# Altium footprint library Reflow3D1411sep.PcbLib: 657 footprints (part 40 of 42)
Each footprint in its own frame and in the unit in brackets; x right, y up, seen from the top. Pads: shape width x height; smd on the part's side, far side on the other; paste and mask are expansions set on the pad; w line width, h text height; cw(c..) or ccw(c..) is an arc to the next point about the centre after c.
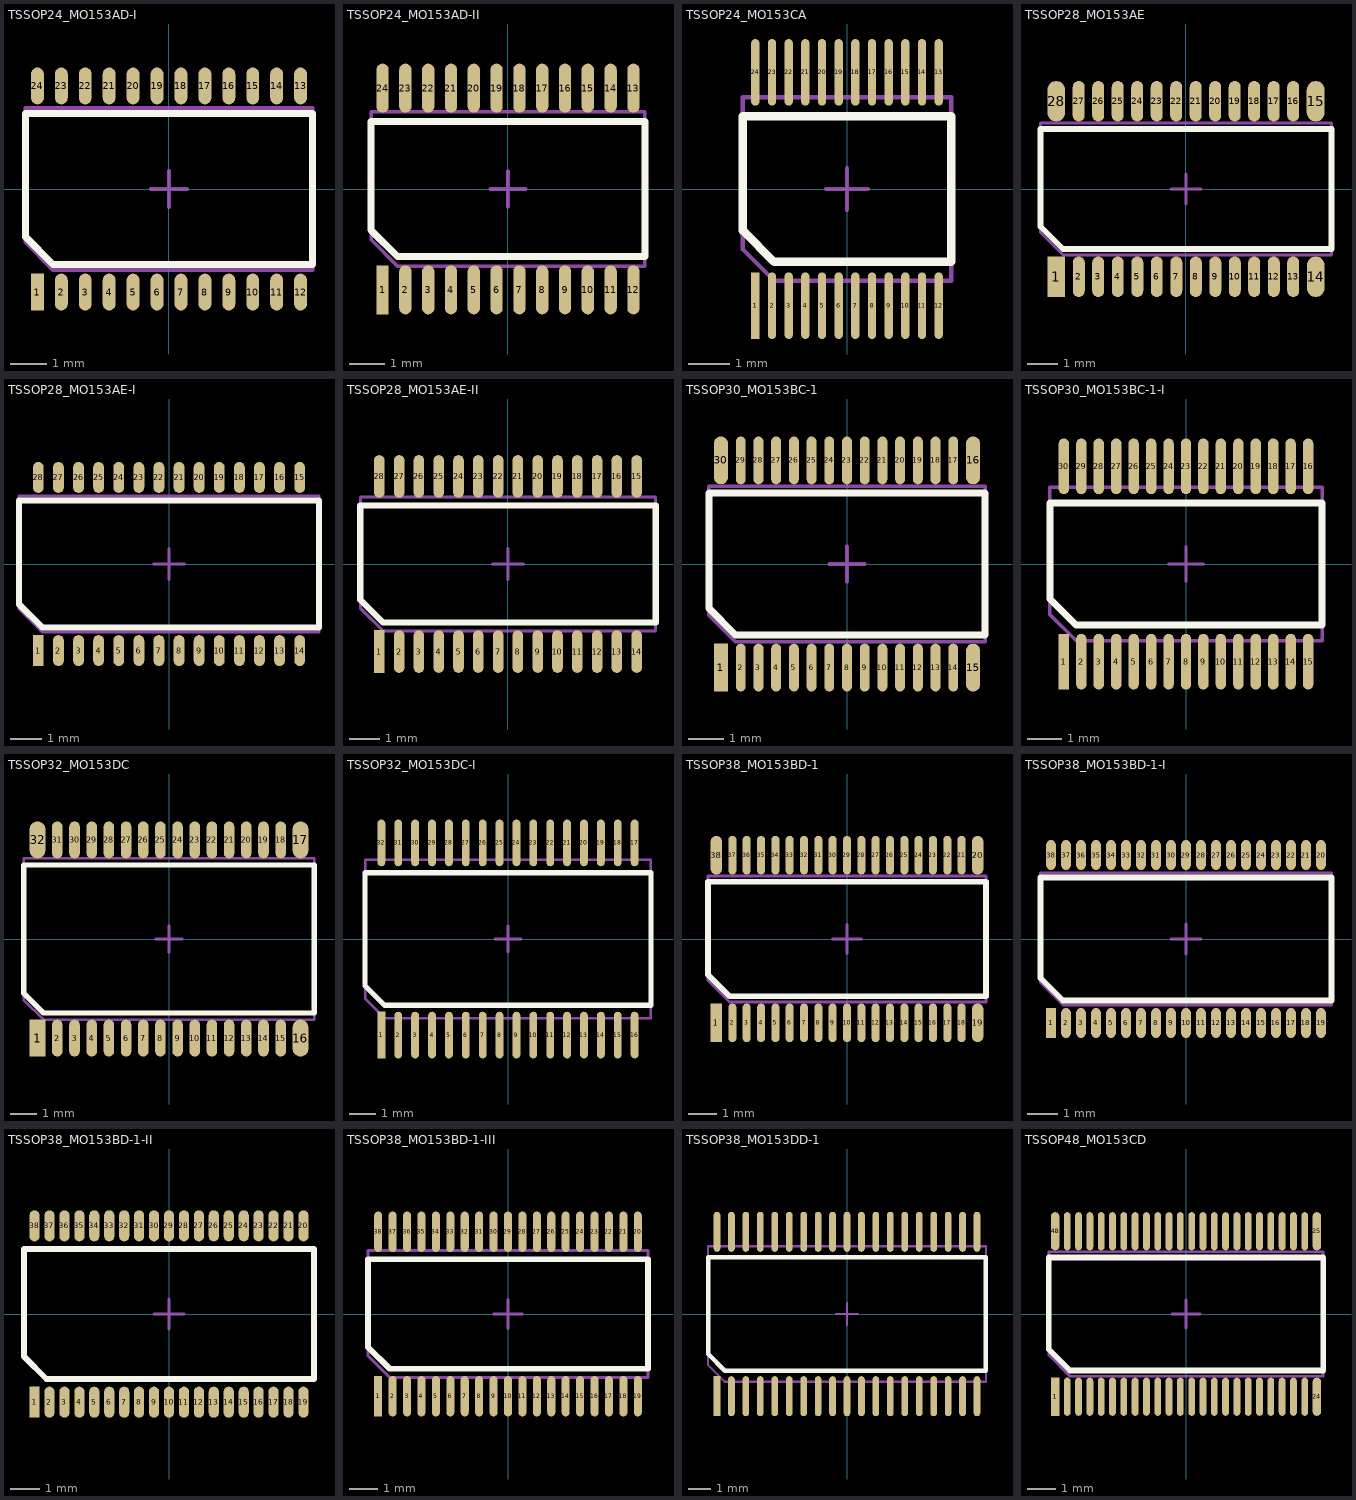
[diagram p39: the footprints below, top view; thin cyan lines are the x and y axes]

## TSSOP24_MO153AD-I [mm] "www.analog.com, 380523655245964505593671154107510036154RU24.pdf, ru-24.pdf; www.jedec.org, MO-153f.pdf"
height 1.1
pads (24):
  rect 0.35x1 smd mask+0.075: 1(-3.575,-2.8)
  oval 0.35x1 smd mask+0.075: 2(-2.925,-2.8) 3(-2.275,-2.8) 4(-1.625,-2.8) 5(-0.975,-2.8) 6(-0.325,-2.8) 7(0.325,-2.8) 8(0.975,-2.8) 9(1.625,-2.8) 10(2.275,-2.8) 11(2.925,-2.8) 12(3.575,-2.8) 13(3.575,2.8) 14(2.925,2.8) 15(2.275,2.8) 16(1.625,2.8) 17(0.975,2.8) 18(0.325,2.8) 19(-0.325,2.8) 20(-0.975,2.8) 21(-1.625,2.8) 22(-2.275,2.8) 23(-2.925,2.8) 24(-3.575,2.8)
Top Overlay:
  lines w0.2: -3.9,-1.3 -3.15,-2.05 3.9,-2.05 3.9,2.05 -3.9,2.05 -3.9,-1.3
Mechanical 13:
  lines w0.1: -3.9,-1.45 -3.15,-2.2 3.9,-2.2 3.9,2.2 -3.9,2.2 -3.9,-1.45
Mechanical 15:
  lines w0.1: -0.5,0 0.5,0 ; 0,-0.5 0,0.5
3D body: height 1.2, standoff 0, extent -3.95,-2.25 3.95,2.25

## TSSOP24_MO153AD-II [mm] "www.maxim-ic.com, 21-0066.PDF, 90-0118.PDF"
height 1
pads (24):
  rect 0.35x1.4 smd mask+0.075: 1(-3.575,-2.875)
  oval 0.35x1.4 smd mask+0.075: 2(-2.925,-2.875) 3(-2.275,-2.875) 4(-1.625,-2.875) 5(-0.975,-2.875) 6(-0.325,-2.875) 7(0.325,-2.875) 8(0.975,-2.875) 9(1.625,-2.875) 10(2.275,-2.875) 11(2.925,-2.875) 12(3.575,-2.875) 13(3.575,2.875) 14(2.925,2.875) 15(2.275,2.875) 16(1.625,2.875) 17(0.975,2.875) 18(0.325,2.875) 19(-0.325,2.875) 20(-0.975,2.875) 21(-1.625,2.875) 22(-2.275,2.875) 23(-2.925,2.875) 24(-3.575,2.875)
Top Overlay:
  lines w0.2: -3.9,-1.175 -3.9,1.925 3.9,1.925 3.9,-1.925 -3.15,-1.925 -3.9,-1.175
Mechanical 13:
  lines w0.1: -3.9,-1.45 -3.9,2.2 3.9,2.2 3.9,-2.2 -3.15,-2.2 -3.9,-1.45
Mechanical 15:
  lines w0.1: -0.5,0 0.5,0 ; 0,-0.5 0,0.5
3D body: height 1.1, standoff 0, extent -3.95,-2.25 3.95,2.25

## TSSOP24_MO153CA [mm] "www.ti.com, mpds006c.pdf, DGV24.asc"
height 1.1
pads (24):
  rect 0.2x1.6 smd mask+0.05: 1(-2.2,-2.8)
  oval 0.2x1.6 smd mask+0.05: 2(-1.8,-2.8) 3(-1.4,-2.8) 4(-1,-2.8) 5(-0.6,-2.8) 6(-0.2,-2.8) 7(0.2,-2.8) 8(0.6,-2.8) 9(1,-2.8) 10(1.4,-2.8) 11(1.8,-2.8) 12(2.2,-2.8) 13(2.2,2.8) 14(1.8,2.8) 15(1.4,2.8) 16(1,2.8) 17(0.6,2.8) 18(0.2,2.8) 19(-0.2,2.8) 20(-0.6,2.8) 21(-1,2.8) 22(-1.4,2.8) 23(-1.8,2.8) 24(-2.2,2.8)
Top Overlay:
  lines w0.2: -2.5,-1 -2.5,1.75 2.5,1.75 2.5,-1.75 -1.75,-1.75 -2.5,-1
Mechanical 13:
  lines w0.1: -2.5,-1.45 -1.75,-2.2 2.5,-2.2 2.5,2.2 -2.5,2.2 -2.5,-1.45
Mechanical 15:
  lines w0.1: -0.5,0 0.5,0 ; 0,-0.5 0,0.5
3D body: height 1.2, standoff 0, extent -2.55,-2.25 2.55,2.25

## TSSOP28_MO153AE [mm] "www.nxp.com, sot361-1_po.pdf, SOT361-1_fp_reflow.pdf"
height 0.98
pads (28):
  rect 0.6x1.35 smd mask+0.05: 1(-4.325,-2.925)
  oval 0.4x1.35 smd mask+0.05: 2(-3.575,-2.925) 3(-2.925,-2.925) 4(-2.275,-2.925) 5(-1.625,-2.925) 6(-0.975,-2.925) 7(-0.325,-2.925) 8(0.325,-2.925) 9(0.975,-2.925) 10(1.625,-2.925) 11(2.275,-2.925) 12(2.925,-2.925) 13(3.575,-2.925) 16(3.575,2.925) 17(2.925,2.925) 18(2.275,2.925) 19(1.625,2.925) 20(0.975,2.925) 21(0.325,2.925) 22(-0.325,2.925) 23(-0.975,2.925) 24(-1.625,2.925) 25(-2.275,2.925) 26(-2.925,2.925) 27(-3.575,2.925)
  oval 0.6x1.35 smd mask+0.05: 14(4.325,-2.925) 15(4.325,2.925) 28(-4.325,2.925)
Top Overlay:
  lines w0.2: -4.85,-1.25 -4.1,-2 4.85,-2 4.85,2 -4.85,2 -4.85,-1.25
Mechanical 13:
  lines w0.1: -4.85,-1.45 -4.85,2.2 4.85,2.2 4.85,-2.2 -4.1,-2.2 -4.85,-1.45
Mechanical 15:
  lines w0.1: -0.5,0 0.5,0 ; 0,-0.5 0,0.5
3D body: height 1.1, standoff 0, extent -4.9,-2.25 4.9,2.25

## TSSOP28_MO153AE-I [mm] "www.analog.com, 249854663RU_28.pdf, ru-28.pdf; www.jedec.org, MO-153f.pdf"
height 1.1
pads (28):
  rect 0.35x1 smd mask+0.075: 1(-4.225,-2.8)
  oval 0.35x1 smd mask+0.075: 2(-3.575,-2.8) 3(-2.925,-2.8) 4(-2.275,-2.8) 5(-1.625,-2.8) 6(-0.975,-2.8) 7(-0.325,-2.8) 8(0.325,-2.8) 9(0.975,-2.8) 10(1.625,-2.8) 11(2.275,-2.8) 12(2.925,-2.8) 13(3.575,-2.8) 14(4.225,-2.8) 15(4.225,2.8) 16(3.575,2.8) 17(2.925,2.8) 18(2.275,2.8) 19(1.625,2.8) 20(0.975,2.8) 21(0.325,2.8) 22(-0.325,2.8) 23(-0.975,2.8) 24(-1.625,2.8) 25(-2.275,2.8) 26(-2.925,2.8) 27(-3.575,2.8) 28(-4.225,2.8)
Top Overlay:
  lines w0.2: -4.85,-1.3 -4.85,2.05 4.85,2.05 4.85,-2.05 -4.1,-2.05 -4.85,-1.3
Mechanical 13:
  lines w0.1: -4.85,-1.45 -4.85,2.2 4.85,2.2 4.85,-2.2 -4.1,-2.2 -4.85,-1.45
Mechanical 15:
  lines w0.1: -0.5,0 0.5,0 ; 0,-0.5 0,0.5
3D body: height 1.2, standoff 0, extent -4.9,-2.25 4.9,2.25

## TSSOP28_MO153AE-II [mm] "www.maxim-ic.com, 21-0066.PDF, 90-0171.PDF"
height 1
pads (28):
  rect 0.35x1.4 smd mask+0.075: 1(-4.225,-2.875)
  oval 0.35x1.4 smd mask+0.075: 2(-3.575,-2.875) 3(-2.925,-2.875) 4(-2.275,-2.875) 5(-1.625,-2.875) 6(-0.975,-2.875) 7(-0.325,-2.875) 8(0.325,-2.875) 9(0.975,-2.875) 10(1.625,-2.875) 11(2.275,-2.875) 12(2.925,-2.875) 13(3.575,-2.875) 14(4.225,-2.875) 15(4.225,2.875) 16(3.575,2.875) 17(2.925,2.875) 18(2.275,2.875) 19(1.625,2.875) 20(0.975,2.875) 21(0.325,2.875) 22(-0.325,2.875) 23(-0.975,2.875) 24(-1.625,2.875) 25(-2.275,2.875) 26(-2.925,2.875) 27(-3.575,2.875) 28(-4.225,2.875)
Top Overlay:
  lines w0.2: -4.85,-1.175 -4.85,1.925 4.85,1.925 4.85,-1.925 -4.1,-1.925 -4.85,-1.175
Mechanical 13:
  lines w0.1: -4.85,-1.45 -4.1,-2.2 4.85,-2.2 4.85,2.2 -4.85,2.2 -4.85,-1.45
Mechanical 15:
  lines w0.1: -0.5,0 0.5,0 ; 0,-0.5 0,0.5
3D body: height 1.1, standoff 0, extent -4.9,-2.25 4.9,2.25

## TSSOP30_MO153BC-1 [mm] "www.nxp.com, sot607-1_po.pdf, sot607-1_fr.pdf"
height 1
pads (30):
  rect 0.4x1.35 smd mask+0.05: 1(-3.56,-2.925)
  oval 0.28x1.35 smd mask+0.05: 2(-3,-2.925) 3(-2.5,-2.925) 4(-2,-2.925) 5(-1.5,-2.925) 6(-1,-2.925) 7(-0.5,-2.925) 8(0,-2.925) 9(0.5,-2.925) 10(1,-2.925) 11(1.5,-2.925) 12(2,-2.925) 13(2.5,-2.925) 14(3,-2.925) 17(3,2.925) 18(2.5,2.925) 19(2,2.925) 20(1.5,2.925) 21(1,2.925) 22(0.5,2.925) 23(0,2.925) 24(-0.5,2.925) 25(-1,2.925) 26(-1.5,2.925) 27(-2,2.925) 28(-2.5,2.925) 29(-3,2.925)
  oval 0.4x1.35 smd mask+0.05: 15(3.56,-2.925) 16(3.56,2.925) 30(-3.56,2.925)
Top Overlay:
  lines w0.2: -3.9,-1.25 -3.9,2 3.9,2 3.9,-2 -3.15,-2 -3.9,-1.25
Mechanical 13:
  lines w0.1: -3.9,-1.45 -3.15,-2.2 3.9,-2.2 3.9,2.2 -3.9,2.2 -3.9,-1.45
Mechanical 15:
  lines w0.1: -0.5,0 0.5,0 ; 0,-0.5 0,0.5
3D body: height 1.1, standoff 0, extent -3.95,-2.25 3.95,2.25

## TSSOP30_MO153BC-1-I [mm] "www.ti.com, mpds019g.pdf, DBT30.asc; www.jedec.org, MO-153f.pdf"
height 1.1
pads (30):
  rect 0.3x1.6 smd mask+0.05: 1(-3.5,-2.8)
  oval 0.3x1.6 smd mask+0.05: 2(-3,-2.8) 3(-2.5,-2.8) 4(-2,-2.8) 5(-1.5,-2.8) 6(-1,-2.8) 7(-0.5,-2.8) 8(0,-2.8) 9(0.5,-2.8) 10(1,-2.8) 11(1.5,-2.8) 12(2,-2.8) 13(2.5,-2.8) 14(3,-2.8) 15(3.5,-2.8) 16(3.5,2.8) 17(3,2.8) 18(2.5,2.8) 19(2,2.8) 20(1.5,2.8) 21(1,2.8) 22(0.5,2.8) 23(0,2.8) 24(-0.5,2.8) 25(-1,2.8) 26(-1.5,2.8) 27(-2,2.8) 28(-2.5,2.8) 29(-3,2.8) 30(-3.5,2.8)
Top Overlay:
  lines w0.2: -3.9,-1 -3.15,-1.75 3.9,-1.75 3.9,1.75 -3.9,1.75 -3.9,-1
Mechanical 13:
  lines w0.1: -3.9,-1.45 -3.9,2.2 3.9,2.2 3.9,-2.2 -3.15,-2.2 -3.9,-1.45
Mechanical 15:
  lines w0.1: -0.5,0 0.5,0 ; 0,-0.5 0,0.5
3D body: height 1.2, standoff 0, extent -3.95,-2.25 3.95,2.25

## TSSOP32_MO153DC [mm] "www.nxp.com, sot487-1_po.pdf, sot487-1_fr.pdf"
height 1
pads (32):
  rect 0.6x1.4 smd mask+0.05: 1(-4.975,-3.75)
  oval 0.4x1.4 smd mask+0.05: 2(-4.225,-3.75) 3(-3.575,-3.75) 4(-2.925,-3.75) 5(-2.275,-3.75) 6(-1.625,-3.75) 7(-0.975,-3.75) 8(-0.325,-3.75) 9(0.325,-3.75) 10(0.975,-3.75) 11(1.625,-3.75) 12(2.275,-3.75) 13(2.925,-3.75) 14(3.575,-3.75) 15(4.225,-3.75) 18(4.225,3.75) 19(3.575,3.75) 20(2.925,3.75) 21(2.275,3.75) 22(1.625,3.75) 23(0.975,3.75) 24(0.325,3.75) 25(-0.325,3.75) 26(-0.975,3.75) 27(-1.625,3.75) 28(-2.275,3.75) 29(-2.925,3.75) 30(-3.575,3.75) 31(-4.225,3.75)
  oval 0.6x1.4 smd mask+0.05: 16(4.975,-3.75) 17(4.975,3.75) 32(-4.975,3.75)
Top Overlay:
  lines w0.2: -5.5,-2.05 -4.75,-2.8 5.5,-2.8 5.5,2.8 -5.5,2.8 -5.5,-2.05
Mechanical 13:
  lines w0.1: -5.5,-2.3 -5.5,3.05 5.5,3.05 5.5,-3.05 -4.75,-3.05 -5.5,-2.3
Mechanical 15:
  lines w0.1: -0.5,0 0.5,0 ; 0,-0.5 0,0.5
3D body: height 1.1, standoff 0, extent -5.55,-3.1 5.55,3.1

## TSSOP32_MO153DC-I [mm] "www.ti.com, mtss002e.pdf, DA32.asc; www.jedec.org, MO-153f.pdf"
height 1.1
pads (32):
  rect 0.3x1.8 smd mask+0.075: 1(-4.875,-3.7)
  oval 0.3x1.8 smd mask+0.075: 2(-4.225,-3.7) 3(-3.575,-3.7) 4(-2.925,-3.7) 5(-2.275,-3.7) 6(-1.625,-3.7) 7(-0.975,-3.7) 8(-0.325,-3.7) 9(0.325,-3.7) 10(0.975,-3.7) 11(1.625,-3.7) 12(2.275,-3.7) 13(2.925,-3.7) 14(3.575,-3.7) 15(4.225,-3.7) 16(4.875,-3.7) 17(4.875,3.7) 18(4.225,3.7) 19(3.575,3.7) 20(2.925,3.7) 21(2.275,3.7) 22(1.625,3.7) 23(0.975,3.7) 24(0.325,3.7) 25(-0.325,3.7) 26(-0.975,3.7) 27(-1.625,3.7) 28(-2.275,3.7) 29(-2.925,3.7) 30(-3.575,3.7) 31(-4.225,3.7) 32(-4.875,3.7)
Top Overlay:
  lines w0.2: -5.5,-1.8 -5.5,2.55 5.5,2.55 5.5,-2.55 -4.75,-2.55 -5.5,-1.8
Mechanical 13:
  lines w0.1: -5.5,-2.3 -4.75,-3.05 5.5,-3.05 5.5,3.05 -5.5,3.05 -5.5,-2.3
Mechanical 15:
  lines w0.1: -0.5,0 0.5,0 ; 0,-0.5 0,0.5
3D body: height 1.2, standoff 0, extent -5.55,-3.1 5.55,3.1

## TSSOP38_MO153BD-1 [mm] "www.nxp.com, sot510-1_po.pdf, sot510-1_fr.pdf"
height 1
pads (38):
  rect 0.4x1.35 smd mask+0.05: 1(-4.56,-2.925)
  oval 0.28x1.35 smd mask+0.05: 2(-4,-2.925) 3(-3.5,-2.925) 4(-3,-2.925) 5(-2.5,-2.925) 6(-2,-2.925) 7(-1.5,-2.925) 8(-1,-2.925) 9(-0.5,-2.925) 10(0,-2.925) 11(0.5,-2.925) 12(1,-2.925) 13(1.5,-2.925) 14(2,-2.925) 15(2.5,-2.925) 16(3,-2.925) 17(3.5,-2.925) 18(4,-2.925) 21(4,2.925) 22(3.5,2.925) 23(3,2.925) 24(2.5,2.925) 25(2,2.925) 26(1.5,2.925) 27(1,2.925) 28(0.5,2.925) 29(0,2.925) 30(-0.5,2.925) 31(-1,2.925) 32(-1.5,2.925) 33(-2,2.925) 34(-2.5,2.925) 35(-3,2.925) 36(-3.5,2.925) 37(-4,2.925)
  oval 0.4x1.35 smd mask+0.05: 19(4.56,-2.925) 20(4.56,2.925) 38(-4.56,2.925)
Top Overlay:
  lines w0.2: -4.85,-1.25 -4.85,2 4.85,2 4.85,-2 -4.1,-2 -4.85,-1.25
Mechanical 13:
  lines w0.1: -4.85,-1.45 -4.85,2.2 4.85,2.2 4.85,-2.2 -4.1,-2.2 -4.85,-1.45
Mechanical 15:
  lines w0.1: -0.5,0 0.5,0 ; 0,-0.5 0,0.5
3D body: height 1.1, standoff 0, extent -4.9,-2.25 4.9,2.25

## TSSOP38_MO153BD-1-I [mm] "www.analog.com, 36817415413609854197792024125RU38.pdf, ru-38.pdf; www.jedec.org, MO-153f.pdf"
height 1.1
pads (38):
  rect 0.32x1 smd mask+0.075: 1(-4.5,-2.8)
  oval 0.32x1 smd mask+0.075: 2(-4,-2.8) 3(-3.5,-2.8) 4(-3,-2.8) 5(-2.5,-2.8) 6(-2,-2.8) 7(-1.5,-2.8) 8(-1,-2.8) 9(-0.5,-2.8) 10(0,-2.8) 11(0.5,-2.8) 12(1,-2.8) 13(1.5,-2.8) 14(2,-2.8) 15(2.5,-2.8) 16(3,-2.8) 17(3.5,-2.8) 18(4,-2.8) 19(4.5,-2.8) 20(4.5,2.8) 21(4,2.8) 22(3.5,2.8) 23(3,2.8) 24(2.5,2.8) 25(2,2.8) 26(1.5,2.8) 27(1,2.8) 28(0.5,2.8) 29(0,2.8) 30(-0.5,2.8) 31(-1,2.8) 32(-1.5,2.8) 33(-2,2.8) 34(-2.5,2.8) 35(-3,2.8) 36(-3.5,2.8) 37(-4,2.8) 38(-4.5,2.8)
Top Overlay:
  lines w0.2: -4.85,-1.3 -4.85,2.05 4.85,2.05 4.85,-2.05 -4.1,-2.05 -4.85,-1.3
Top Solder:
  region: 4.215,3.225 4.215,2.375 4.285,2.375 4.285,3.225
  region: 3.715,3.225 3.715,2.375 3.785,2.375 3.785,3.225
  region: 3.215,3.225 3.215,2.375 3.285,2.375 3.285,3.225
  region: 2.715,3.225 2.715,2.375 2.785,2.375 2.785,3.225
  region: 2.215,3.225 2.215,2.375 2.285,2.375 2.285,3.225
  region: 1.715,3.225 1.715,2.375 1.785,2.375 1.785,3.225
  region: 1.215,3.225 1.215,2.375 1.285,2.375 1.285,3.225
  region: 0.715,3.225 0.715,2.375 0.785,2.375 0.785,3.225
  region: 0.215,3.225 0.215,2.375 0.285,2.375 0.285,3.225
  region: -0.285,3.225 -0.285,2.375 -0.215,2.375 -0.215,3.225
  region: -0.785,3.225 -0.785,2.375 -0.715,2.375 -0.715,3.225
  region: -1.285,3.225 -1.285,2.375 -1.215,2.375 -1.215,3.225
  region: -1.785,3.225 -1.785,2.375 -1.715,2.375 -1.715,3.225
  region: -2.285,3.225 -2.285,2.375 -2.215,2.375 -2.215,3.225
  region: -2.785,3.225 -2.785,2.375 -2.715,2.375 -2.715,3.225
  region: -3.285,3.225 -3.285,2.375 -3.215,2.375 -3.215,3.225
  region: -3.785,3.225 -3.785,2.375 -3.715,2.375 -3.715,3.225
  region: -4.285,3.225 -4.285,2.375 -4.215,2.375 -4.215,3.225
  region: -4.265,-2.375 -4.265,-3.225 -4.215,-3.225 -4.215,-2.375
  region: -3.785,-2.375 -3.785,-3.225 -3.715,-3.225 -3.715,-2.375
  region: -3.285,-2.375 -3.285,-3.225 -3.215,-3.225 -3.215,-2.375
  region: -2.785,-2.375 -2.785,-3.225 -2.715,-3.225 -2.715,-2.375
  region: -2.285,-2.375 -2.285,-3.225 -2.215,-3.225 -2.215,-2.375
  region: -1.785,-2.375 -1.785,-3.225 -1.715,-3.225 -1.715,-2.375
  region: -1.285,-2.375 -1.285,-3.225 -1.215,-3.225 -1.215,-2.375
  region: -0.785,-2.375 -0.785,-3.225 -0.715,-3.225 -0.715,-2.375
  region: -0.285,-2.375 -0.285,-3.225 -0.215,-3.225 -0.215,-2.375
  region: 0.215,-2.375 0.215,-3.225 0.285,-3.225 0.285,-2.375
  region: 0.715,-2.375 0.715,-3.225 0.785,-3.225 0.785,-2.375
  region: 1.215,-2.375 1.215,-3.225 1.285,-3.225 1.285,-2.375
  region: 1.715,-2.375 1.715,-3.225 1.785,-3.225 1.785,-2.375
  region: 2.215,-2.375 2.215,-3.225 2.285,-3.225 2.285,-2.375
  region: 2.715,-2.375 2.715,-3.225 2.785,-3.225 2.785,-2.375
  region: 3.215,-2.375 3.215,-3.225 3.285,-3.225 3.285,-2.375
  region: 3.715,-2.375 3.715,-3.225 3.785,-3.225 3.785,-2.375
  region: 4.215,-2.375 4.215,-3.225 4.285,-3.225 4.285,-2.375
Mechanical 13:
  lines w0.1: -4.85,-1.45 -4.1,-2.2 4.85,-2.2 4.85,2.2 -4.85,2.2 -4.85,-1.45
Mechanical 15:
  lines w0.1: -0.5,0 0.5,0 ; 0,-0.5 0,0.5
3D body: height 1.2, standoff 0, extent -4.9,-2.25 4.9,2.25

## TSSOP38_MO153BD-1-II [mm] "www.analog.com, 36817415413609854197792024125RU38.pdf, 792960952ru_38.pdf; www.jedec.org, MO-153f.pdf"
height 1.1
pads (38):
  rect 0.34x1.04 smd mask+0.085: 1(-4.5,-2.95)
  oval 0.34x1.04 smd mask+0.085: 2(-4,-2.95) 3(-3.5,-2.95) 4(-3,-2.95) 5(-2.5,-2.95) 6(-2,-2.95) 7(-1.5,-2.95) 8(-1,-2.95) 9(-0.5,-2.95) 10(0,-2.95) 11(0.5,-2.95) 12(1,-2.95) 13(1.5,-2.95) 14(2,-2.95) 15(2.5,-2.95) 16(3,-2.95) 17(3.5,-2.95) 18(4,-2.95) 19(4.5,-2.95) 20(4.5,2.95) 21(4,2.95) 22(3.5,2.95) 23(3,2.95) 24(2.5,2.95) 25(2,2.95) 26(1.5,2.95) 27(1,2.95) 28(0.5,2.95) 29(0,2.95) 30(-0.5,2.95) 31(-1,2.95) 32(-1.5,2.95) 33(-2,2.95) 34(-2.5,2.95) 35(-3,2.95) 36(-3.5,2.95) 37(-4,2.95) 38(-4.5,2.95)
Top Overlay:
  lines w0.2: -4.85,-1.425 -4.1,-2.175 4.85,-2.175 4.85,2.175 -4.85,2.175 -4.85,-1.425
Mechanical 13:
  lines w0.1: -4.85,-1.45 -4.1,-2.2 4.85,-2.2 4.85,2.2 -4.85,2.2 -4.85,-1.45
Mechanical 15:
  lines w0.1: -0.5,0 0.5,0 ; 0,-0.5 0,0.5
3D body: height 1.2, standoff 0, extent -4.9,-2.25 4.9,2.25

## TSSOP38_MO153BD-1-III [mm] "www.maxim-ic.com, 21-0081.PDF, 90-0140.PDF"
height 1
pads (38):
  rect 0.28x1.4 smd mask+0.05: 1(-4.5,-2.85)
  oval 0.28x1.4 smd mask+0.05: 2(-4,-2.85) 3(-3.5,-2.85) 4(-3,-2.85) 5(-2.5,-2.85) 6(-2,-2.85) 7(-1.5,-2.85) 8(-1,-2.85) 9(-0.5,-2.85) 10(0,-2.85) 11(0.5,-2.85) 12(1,-2.85) 13(1.5,-2.85) 14(2,-2.85) 15(2.5,-2.85) 16(3,-2.85) 17(3.5,-2.85) 18(4,-2.85) 19(4.5,-2.85) 20(4.5,2.85) 21(4,2.85) 22(3.5,2.85) 23(3,2.85) 24(2.5,2.85) 25(2,2.85) 26(1.5,2.85) 27(1,2.85) 28(0.5,2.85) 29(0,2.85) 30(-0.5,2.85) 31(-1,2.85) 32(-1.5,2.85) 33(-2,2.85) 34(-2.5,2.85) 35(-3,2.85) 36(-3.5,2.85) 37(-4,2.85) 38(-4.5,2.85)
Top Overlay:
  lines w0.2: -4.85,-1.15 -4.85,1.9 4.85,1.9 4.85,-1.9 -4.1,-1.9 -4.85,-1.15
Mechanical 13:
  lines w0.1: -4.85,-1.45 -4.85,2.2 4.85,2.2 4.85,-2.2 -4.1,-2.2 -4.85,-1.45
Mechanical 15:
  lines w0.1: -0.5,0 0.5,0 ; 0,-0.5 0,0.5
3D body: height 1.1, standoff 0, extent -4.9,-2.25 4.9,2.25

## TSSOP38_MO153DD-1 [mm] "www.ti.com, msp430f5132.pdf"
height 1.1
pads (38):
  rect 0.3x1.8 smd mask+0.075: 1(-5.85,-3.7)
  oval 0.3x1.8 smd mask+0.075: 2(-5.2,-3.7) 3(-4.55,-3.7) 4(-3.9,-3.7) 5(-3.25,-3.7) 6(-2.6,-3.7) 7(-1.95,-3.7) 8(-1.3,-3.7) 9(-0.65,-3.7) 10(0,-3.7) 11(0.65,-3.7) 12(1.3,-3.7) 13(1.95,-3.7) 14(2.6,-3.7) 15(3.25,-3.7) 16(3.9,-3.7) 17(4.55,-3.7) 18(5.2,-3.7) 19(5.85,-3.7) 20(5.85,3.7) 21(5.2,3.7) 22(4.55,3.7) 23(3.9,3.7) 24(3.25,3.7) 25(2.6,3.7) 26(1.95,3.7) 27(1.3,3.7) 28(0.65,3.7) 29(0,3.7) 30(-0.65,3.7) 31(-1.3,3.7) 32(-1.95,3.7) 33(-2.6,3.7) 34(-3.25,3.7) 35(-3.9,3.7) 36(-4.55,3.7) 37(-5.2,3.7) 38(-5.85,3.7)
Top Overlay:
  lines w0.2: -6.25,-1.8 -5.5,-2.55 6.25,-2.55 6.25,2.55 -6.25,2.55 -6.25,-1.8
Mechanical 13:
  lines w0.1: -6.25,-2.3 -5.5,-3.05 6.25,-3.05 6.25,3.05 -6.25,3.05 -6.25,-2.3
Mechanical 15:
  lines w0.1: -0.5,0 0.5,0 ; 0,-0.5 0,0.5
3D body: height 1.2, standoff 0, extent -6.3,-3.1 6.3,3.1

## TSSOP48_MO153CD [mm] "www.nxp.com, sot480-1_po.pdf, sot480-1_fr.pdf"
height 1
pads (48):
  rect 0.3x1.35 smd mask+0.085: 1(-4.63,-2.925)
  oval 0.24x1.35 smd mask+0.085: 2(-4.2,-2.925) 3(-3.8,-2.925) 4(-3.4,-2.925) 5(-3,-2.925) 6(-2.6,-2.925) 7(-2.2,-2.925) 8(-1.8,-2.925) 9(-1.4,-2.925) 10(-1,-2.925) 11(-0.6,-2.925) 12(-0.2,-2.925) 13(0.2,-2.925) 14(0.6,-2.925) 15(1,-2.925) 16(1.4,-2.925) 17(1.8,-2.925) 18(2.2,-2.925) 19(2.6,-2.925) 20(3,-2.925) 21(3.4,-2.925) 22(3.8,-2.925) 23(4.2,-2.925) 26(4.2,2.925) 27(3.8,2.925) 28(3.4,2.925) 29(3,2.925) 30(2.6,2.925) 31(2.2,2.925) 32(1.8,2.925) 33(1.4,2.925) 34(1,2.925) 35(0.6,2.925) 36(0.2,2.925) 37(-0.2,2.925) 38(-0.6,2.925) 39(-1,2.925) 40(-1.4,2.925) 41(-1.8,2.925) 42(-2.2,2.925) 43(-2.6,2.925) 44(-3,2.925) 45(-3.4,2.925) 46(-3.8,2.925) 47(-4.2,2.925)
  oval 0.3x1.35 smd mask+0.085: 24(4.63,-2.925) 25(4.63,2.925) 48(-4.63,2.925)
Top Overlay:
  lines w0.2: -4.85,-1.25 -4.1,-2 4.85,-2 4.85,2 -4.85,2 -4.85,-1.25
Mechanical 13:
  lines w0.1: -4.85,-1.45 -4.1,-2.2 4.85,-2.2 4.85,2.2 -4.85,2.2 -4.85,-1.45
Mechanical 15:
  lines w0.1: -0.5,0 0.5,0 ; 0,-0.5 0,0.5
3D body: height 1.1, standoff 0, extent -4.9,-2.25 4.9,2.25